# Altium footprint library Modules.PcbLib: 10 footprints
Each footprint in its own frame and in the unit in brackets; x right, y up, seen from the top. Pads: shape width x height; smd on the part's side, far side on the other; paste and mask are expansions set on the pad; w line width, h text height; cw(c..) or ccw(c..) is an arc to the next point about the centre after c.
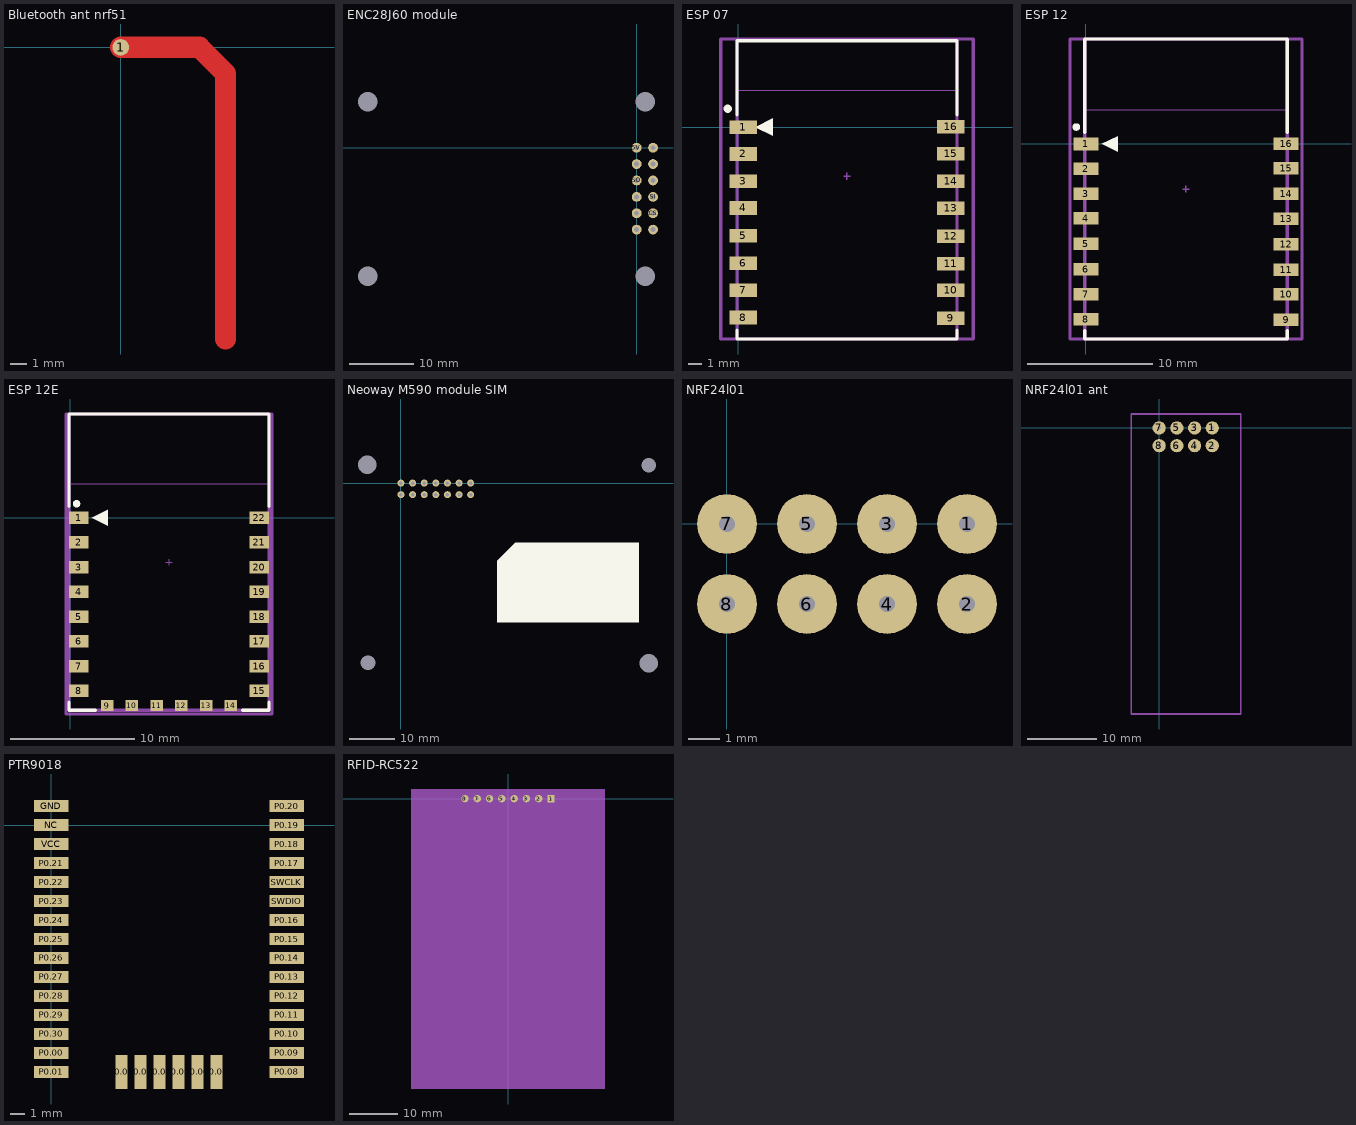
[diagram p0: the footprints below, top view; thin cyan lines are the x and y axes]

## Bluetooth ant nrf51 [mm]
pads (1):
  round 1 smd: 1(0,0)
Top Layer:
  lines w1.27: 0,0 4.689,0 6.248,-1.559 6.248,-17.401

## ENC28J60 module [mil] "ethernet module"
pads (16):
  round 60 hole 30: 3.3V(0,-500) 5V(0,0) CLKOUT(100,-100) CS(100,-400) GND(100,-500) GND(100,0) INT(0,-100) RST(0,-400) SCK(0,-300) SI(100,-300) SO(0,-200) WOL(100,-200)
  round 0 / inner round 0 / far side round 275.59 hole 118.11: ""(-1641.73,-783.46) ""(-1641.73,279.53) ""(51.18,-783.46) ""(51.18,279.53)
3D body "ENC28J60 module bottom contacts.STEP": height 691.05, standoff -231.78, extent -1779.59,-892.27 188.91,387.25

## ESP 07 [mm] "ESP-12 Wi-Fi Module by AI-Thinker"
pads (16):
  rect 2x1 smd: 1(0.381,0) 2(0.381,-1.97) 3(0.381,-3.97) 4(0.381,-5.94) 5(0.381,-7.98) 6(0.381,-9.99) 7(0.381,-11.98) 8(0.381,-13.99) 9(15.619,-14.03) 10(15.619,-11.99) 11(15.619,-10.03) 12(15.619,-8.01) 13(15.619,-5.95) 14(15.619,-3.97) 15(15.619,-1.95) 16(15.619,0.03)
Top Overlay:
  circle w0.3: c-0.762,1.356 r0.15
  region: 1.27,0 2.54,-0.635 2.54,0.635
  lines w0.254: -0.084,-14.916 -0.084,-15.568 16.084,-15.568 16.084,-14.916 ; -0.084,0.916 -0.084,6.35 16.084,6.35 16.084,0.916
Mechanical 13:
  lines w0.051: -0.127,2.727 16.129,2.727 16.129,6.35 -0.127,6.35 -0.127,2.727
  lines w0.254: -0.084,-15.568 -0.084,6.375 16.084,6.375 16.084,-15.568 -0.084,-15.568
  text "ANTENNA AREA" at 0.254,5.715 h0.25
  text "CUTOUT POLYGON" at 0.254,5.207 h0.25
Mechanical 15:
  lines w0.1: 7.746,-3.598 8.254,-3.598 ; 8,-3.852 8,-3.344
  lines w0.254: -1.27,-15.568 17.272,-15.568 17.272,6.477 -1.27,6.477 -1.27,-15.568
3D body "User Library-ESP07-1.step": height 3.51, standoff 0, extent 0,-15.65 16,6.35

## ESP 12 [mm] "ESP-12 Wi-Fi Module by AI-Thinker"
pads (16):
  rect 2x1 smd: 1(0,0) 2(0,-1.97) 3(0,-3.97) 4(0,-5.94) 5(0,-7.98) 6(0,-9.99) 7(0,-11.98) 8(0,-13.99) 9(16,-14.03) 10(16,-11.99) 11(16,-10.03) 12(16,-8.01) 13(16,-5.95) 14(16,-3.97) 15(16,-1.95) 16(16,0.03)
Top Overlay:
  circle w0.3: c-0.762,1.356 r0.15
  region: 1.27,0 2.54,-0.635 2.54,0.635
  lines w0.254: -0.084,-14.916 -0.084,-15.568 16.084,-15.568 16.084,-14.916 ; -0.084,0.916 -0.084,8.371 16.084,8.371 16.084,0.916
Mechanical 13:
  lines w0.051: -0.127,2.727 16.129,2.727 16.129,8.382 -0.127,8.382 -0.127,2.727
  lines w0.254: -0.084,-15.568 -0.084,8.371 16.084,8.371 16.084,-15.568 -0.084,-15.568
  text "ANTENNA AREA" at 0.127,7.874 h0.25
  text "CUTOUT POLYGON" at 0.127,7.366 h0.25
Mechanical 15:
  lines w0.1: 7.746,-3.598 8.254,-3.598 ; 8,-3.852 8,-3.344
  lines w0.254: -1.27,-15.568 17.272,-15.568 17.272,8.371 -1.27,8.371 -1.27,-15.568
3D body "ESP_12_E.STEP": height 2.75, standoff 0.04, extent 0.001,-15.491 16.001,8.509

## ESP 12E [mm] "ESP-12E Wi-Fi Module by AI-Thinker"
height 3.2
pads (22):
  rect 1.6x1 smd: 1(0.7,0) 2(0.7,-2) 3(0.7,-4) 4(0.7,-6) 5(0.7,-8) 6(0.7,-10) 7(0.7,-12) 8(0.7,-14) 15(15.3,-14) 16(15.3,-12) 17(15.3,-10) 18(15.3,-8) 19(15.3,-6) 20(15.3,-4) 21(15.3,-2) 22(15.3,0)
  rect 1x0.9 smd: 9(3,-15.2) 10(5,-15.2) 11(7,-15.2) 12(9,-15.2) 13(11,-15.2) 14(13,-15.2)
Top Overlay:
  circle w0.3: c0.525,1.125 r0.15
  region: 1.77,0 3.04,-0.635 3.04,0.635
  lines w0.254: -0.084,-14.916 -0.084,-15.568 2.068,-15.568 ; -0.084,0.916 -0.084,8.371 16.084,8.371 16.084,0.916 ; 13.932,-15.568 16.084,-15.568 16.084,-14.916
Mechanical 13:
  lines w0.051: -0.127,2.727 -0.127,8.382 16.129,8.382 16.129,2.727 -0.127,2.727
  lines w0.254: -0.084,-15.568 16.084,-15.568 16.084,8.371 -0.084,8.371 -0.084,-15.568
  text "CUTOUT POLYGON" at 1.499,7.315 h0.25
  text "ANTENNA AREA" at 1.499,7.823 h0.25
Mechanical 15:
  lines w0.1: 7.746,-3.598 8.254,-3.598 ; 8,-3.852 8,-3.344
  lines w0.254: -0.325,-15.875 -0.325,8.371 16.325,8.371 16.325,-15.875 -0.325,-15.875
3D body "ESP_12_E.STEP": height 2.75, standoff 0.04, extent 0.001,-15.491 16.001,8.509

## Neoway M590 module SIM [mil] "GSM, GPRS cullular module"
pads (18):
  round 60 hole 30: BOOT(600,0) DCD(500,-100) DTR(600,-100) GND(0,-100) GND(0,0) RING(500,0) RST(200,-100) RX(300,0) TX(300,-100) VCC(100,-100) VCC(100,0) ""(200,0) ""(400,-100) ""(400,0)
  round 0 / inner round 0 / far side round 354.33 hole 157.48 unplated: ""(-291.34,157.48) ""(2133.86,-1551.18)
  round 0 / inner round 0 / far side round 275.59 hole 125.98 unplated: ""(-283.46,-1547.24) ""(2133.86,153.54)
Top Overlay:
  region: 984.25,-511.81 2047.24,-511.81 2047.24,-1197.24 826.77,-1197.24 826.77,-669.29
3D body "Neoway M590.STEP": height 317.04, standoff -231.78, extent -405,-1665.47 2252.48,275.47

## NRF24l01 [mm]
pads (8):
  round 1.9 hole 0.5: 1(7.62,0) 2(7.62,-2.54) 3(5.08,0) 4(5.08,-2.54) 5(2.54,0) 6(2.54,-2.54) 7(0,0) 8(0,-2.54)
3D body "nRF24L01+_enhanced.STEP": height 6.86, standoff -5.99, extent -5.334,-27.476 9.666,1.524

## NRF24l01 ant [mm]
pads (8):
  round 1.9 hole 0.5: 1(7.62,0) 2(7.62,-2.54) 3(5.08,0) 4(5.08,-2.54) 5(2.54,0) 6(2.54,-2.54) 7(0,0) 8(0,-2.54)
Mechanical 1:
  lines w0.1: -0.2,-2.74 0.2,-2.74 0.2,-2.34 -0.2,-2.34 -0.2,-2.74 ; -0.2,-0.2 -0.2,0.2 0.2,0.2 0.2,-0.2 -0.2,-0.2 ; 2.34,-2.74 2.74,-2.74 2.74,-2.34 2.34,-2.34 2.34,-2.74 ; 2.34,-0.2 2.74,-0.2 2.74,0.2 2.34,0.2 2.34,-0.2 ; 4.88,-2.74 5.28,-2.74 5.28,-2.34 4.88,-2.34 4.88,-2.74 ; 4.88,-0.2 5.28,-0.2 5.28,0.2 4.88,0.2 4.88,-0.2 ; 7.42,-2.74 7.82,-2.74 7.82,-2.34 7.42,-2.34 7.42,-2.74 ; 7.42,-0.2 7.82,-0.2 7.82,0.2 7.42,0.2 7.42,-0.2
  lines w0.254: -4,-41 -4,2 11.7,2 11.7,0 11.7,-25.3 11.7,-41 -4,-41
3D body: height 2.5, standoff -3, extent 7.421,-0.199 7.819,0.199
3D body: height 2.5, standoff -3, extent 4.881,-0.199 5.279,0.199
3D body: height 2.5, standoff -3, extent 7.421,-2.739 7.819,-2.341
3D body: height 2.5, standoff -3, extent 4.881,-2.739 5.279,-2.341
3D body: height 2.5, standoff -3, extent 2.341,-0.199 2.739,0.199
3D body: height 2.5, standoff -3, extent -0.199,-0.199 0.199,0.199
3D body: height 2.5, standoff -3, extent 2.341,-2.739 2.739,-2.341
3D body: height 2.5, standoff -3, extent -0.199,-2.739 0.199,-2.341
3D body: height 2, standoff 0, extent -4.127,-41.127 11.827,2.127

## PTR9018 [mil] "NRF51 module"
pads (36):
  rect 90x32 smd: GND(0,50) NC(0,0) P0.00(0,-600) P0.01(0,-650) P0.08(620,-650) P0.09(620,-600) P0.10(620,-550) P0.11(620,-500) P0.12(620,-450) P0.13(620,-400) P0.14(620,-350) P0.15(620,-300) P0.16(620,-250) P0.17(620,-100) P0.18(620,-50) P0.19(620,0) P0.20(620,50) P0.21(0,-100) P0.22(0,-150) P0.23(0,-200) P0.24(0,-250) P0.25(0,-300) P0.26(0,-350) P0.27(0,-400) P0.28(0,-450) P0.29(0,-500) P0.30(0,-550) SWCLK(620,-150) SWDIO(620,-200) VCC(0,-50)
  rect 32x90 smd: P0.02(185,-650) P0.03(235,-650) P0.04(285,-650) P0.05(335,-650) P0.06(385,-650) P0.07(435,-650)
3D body "Bluetooth module PTR9018.STEP": height 78.74, standoff 0, extent -31.09,-676.93 650.01,216.77

## RFID-RC522 [mil]
pads (8):
  rect 60x60 hole 19.68: 1(350,0)
  round 60 hole 19.68: 2(250,0) 3(150,0) 4(50,0) 5(-50,0) 6(-150,0) 7(-250,0) 8(-350,0)
Mechanical 13:
  rectangle: -787.4,-2362.2 787.4,78.74
3D body: height 59.06, standoff 0, extent -787.4,-2362.2 787.4,78.74